# Altium footprint library Transformers.PcbLib: 80 footprints (part 3 of 6)
Each footprint in its own frame and in the unit in brackets; x right, y up, seen from the top. Pads: shape width x height; smd on the part's side, far side on the other; paste and mask are expansions set on the pad; w line width, h text height; cw(c..) or ccw(c..) is an arc to the next point about the centre after c.
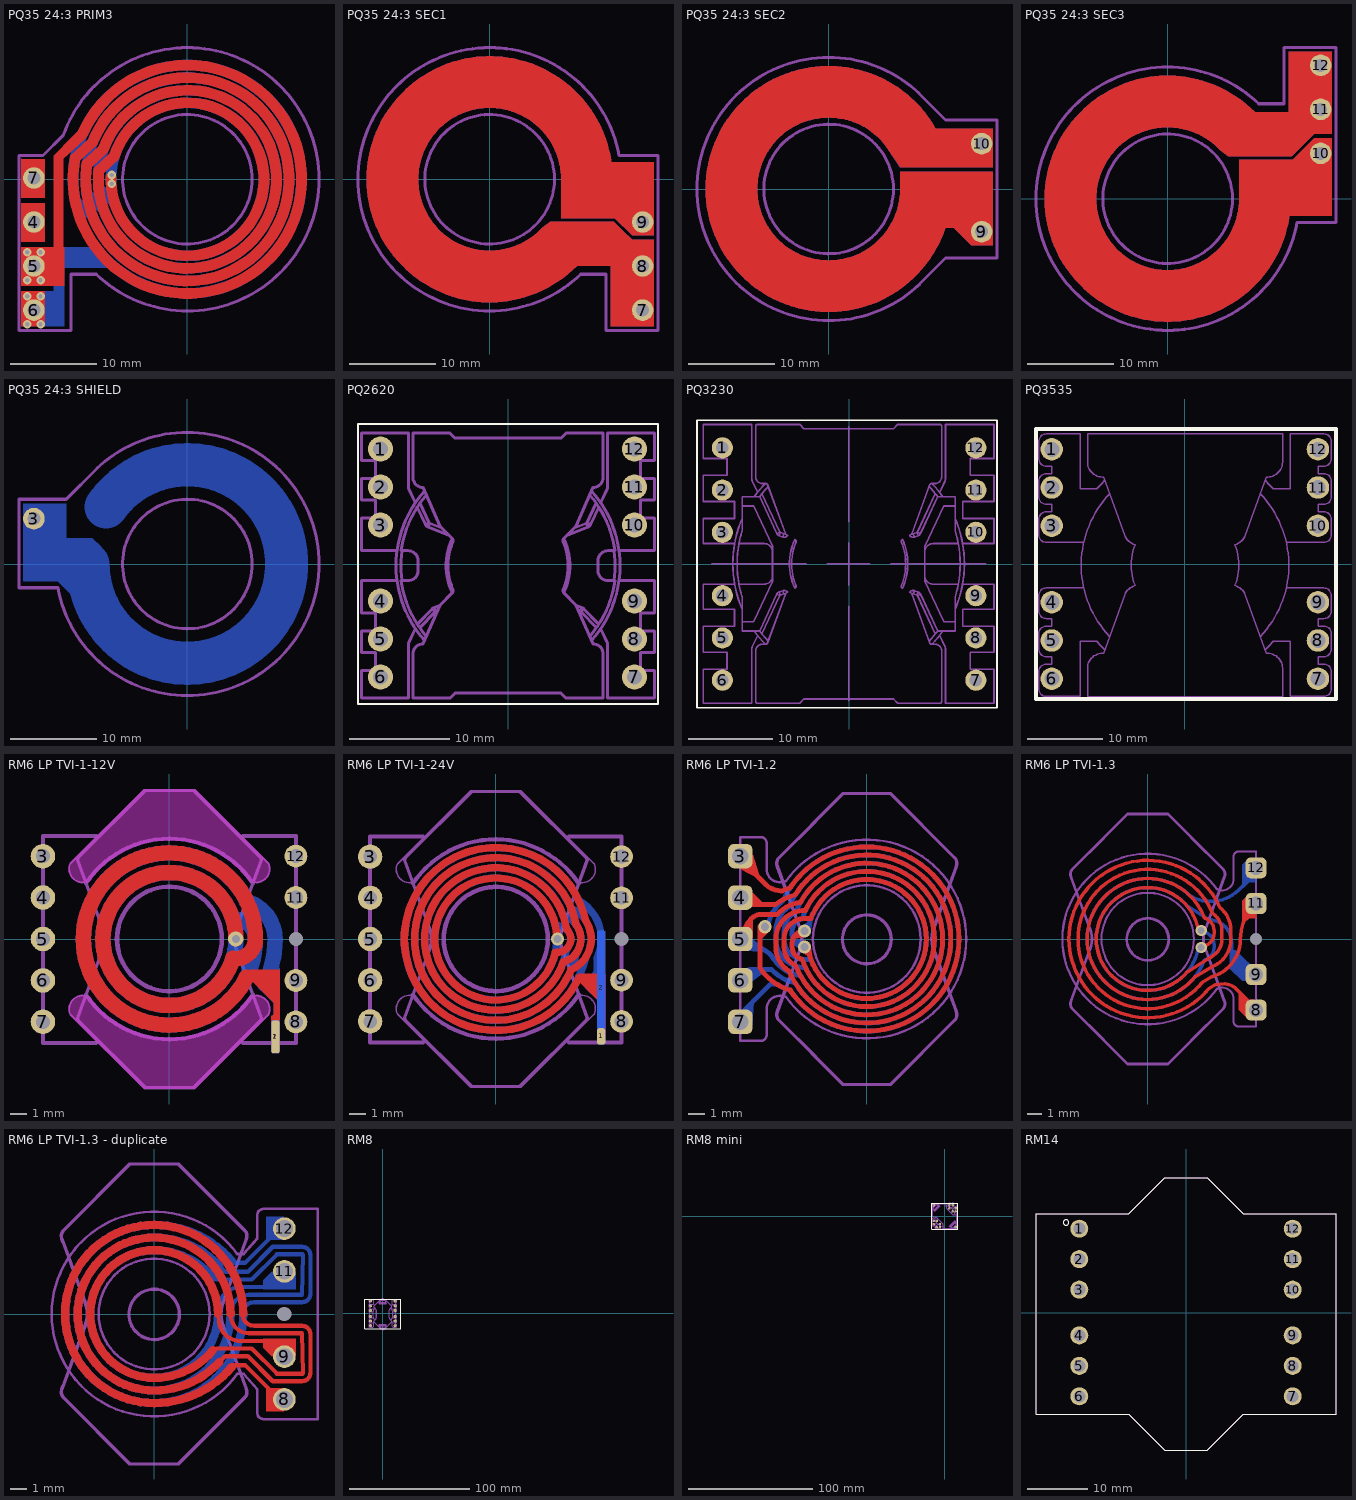
[diagram p2: the footprints below, top view; thin cyan lines are the x and y axes]

## PQ35 24:3 PRIM3 [mm]
pads (4):
  round 2.5 hole 1.5: 4(-17.773,-4.948) 5(-17.773,-10.048) 6(-17.773,-15.148) 7(-17.773,0.152)
via -8.75,0.5 diameter 1 hole 0.5
via -8.75,-0.5 diameter 1 hole 0.5
via -18.546,-11.7 diameter 1 hole 0.5
via -18.546,-8.45 diameter 1 hole 0.5
via -17,-8.45 diameter 1 hole 0.5
via -17,-11.7 diameter 1 hole 0.5
via -18.546,-16.8 diameter 1 hole 0.5
via -18.546,-13.55 diameter 1 hole 0.5
via -17,-13.55 diameter 1 hole 0.5
via -17,-16.8 diameter 1 hole 0.5
Top Layer:
  region: -15.5,-8.832 -15.5,2.752 -15.425,2.812 -15.249,2.886 -15.059,2.908 -14.87,2.876 -14.698,2.794 -14.555,2.666 -14.453,2.504 -14.4,2.32 -14.4,2.225 -14.4,-8.5 -14.4,-8.597 -14.46,-8.78 -14.576,-8.936 -14.734,-9.047 -14.919,-9.103 -15.112,-9.098 -15.294,-9.032 -15.446,-8.913
  region: -19.25,-12.95 -19.25,-17 -16.5,-17 -16.5,-12.95
  region: -19.25,2.35 -19.25,-2.15 -16.5,-2.15 -16.5,2.35
  region: -19.25,-7.85 -19.25,-12.35 -16.5,-12.35 -16.5,-7.85
  region: -19.25,-2.75 -19.25,-7.25 -16.5,-7.25 -16.5,-2.75
  region: 644 vertices and 0 holes, not listed, extent -15.5,-13.824 13.824,13.837
  region: -19.25,-7.85 -19.25,-12.35 -14.25,-12.35 -14.25,-7.85
Bottom Layer:
  region: -10,-7.85 -15,-7.85 -15,-10.25 -8.791,-10.25 -9.543,-8.55 -9.543,-8.439 -9.607,-8.225 -9.728,-8.039 -9.898,-7.895
  region: 629 vertices and 0 holes, not listed, extent -13.832,-13.834 13.824,13.824
  region: -19.25,-12.95 -19.25,-17 -16.5,-17 -16.5,-12.95
  region: -19.25,-7.85 -19.25,-12.35 -16.5,-12.35 -16.5,-7.85
  region: -19.25,-2.75 -19.25,-7.25 -16.5,-7.25 -16.5,-2.75
  region: -19.25,2.35 -19.25,-2.15 -16.5,-2.15 -16.5,2.35
  region: -10,-7.85 -15,-7.85 -15.5,-7.85 -15.5,-13 -14.25,-13 -14.25,-9.25 -10,-9.25 -9.898,-9.205 -9.728,-9.061 -9.607,-8.875 -9.543,-8.661 -9.543,-8.439 -9.607,-8.225 -9.728,-8.039 -9.898,-7.895
  region: -19.25,-12.95 -14.25,-12.95 -14.25,-17 -19.25,-17
  lines w1.2: -17.773,-10.048 -17.548,-10.048
Mechanical 2:
  circle w0.35: c0,0 r7.5
  lines w0.35: -10.53,-11.031 ccw(c0,0) 0,-15.25 ccw(c0,0) 15.25,0 ccw(c0,0) 0,15.25 ccw(c0,0) -14.367,5.114 -16.731,2.75 -19.5,2.75 -19.5,-17.5 -13.5,-17.5 -13.5,-11 -10.53,-11

## PQ35 24:3 SEC1 [mm]
pads (3):
  round 2.5 hole 1.5: 7(17.727,-15.148) 8(17.727,-10.048) 9(17.727,-4.948)
Top Layer:
  rectangle: 16.5,-17 19,-8.5
  rectangle: 16.5,-6.5 19,-3
  region: 19,-17 14,-17 14,-10 10,-10 7,-7 6.1,-5.6 7,-4.9 14.4,-4.9 15.5,-6 16.5,-7 19,-7
  region: 16.5,-6.5 14.5,-4.5 8.3,-4.5 8.3,2 19,2 19,-6.5
  lines w6: 7.963,-7.963 cw(c0,0) 0,-11.262 cw(c0,0) -11.262,0 cw(c0,0) 0,11.262 cw(c0,0) 11.262,0
Bottom Layer:
  region: 16.5,-6.5 14.5,-4.5 8.3,-4.5 8.3,2 19,2 19,-6.5
  region: 19,-17 14,-17 14,-10 10,-10 7,-7 6.1,-5.6 7,-4.9 14.4,-4.9 15.5,-6 16.5,-7 19,-7
  lines w6: 7.963,-7.963 cw(c0,0) 0,-11.262 cw(c0,0) -11.262,0 cw(c0,0) 0,11.262 cw(c0,0) 11.262,0
Mechanical 2:
  circle w0.35: c0,0 r7.5
  lines w0.35: 10.53,-11.031 cw(c0,0) 0,-15.25 cw(c0,0) -15.25,0 cw(c0,0) 0,15.25 cw(c0,0) 15,2.75 19.5,2.75 19.5,-17.5 13.5,-17.5 13.5,-11 10.53,-11

## PQ35 24:3 SEC2 [mm]
pads (2):
  round 2.5 hole 1.5: 9(17.727,-4.948) 10(17.727,5.252)
Top Layer:
  rectangle: 16.5,-6.5 19,-3
  rectangle: 16.5,2.5 19,7
  region: 16.5,-6.5 14.5,-4.5 8.3,-4.5 8.3,2 19,2 19,-6.5
  region: 8.3,7 7.5,3.75 8.3,2.5 19,2.5 19,7
  lines w6: 9.809,5.533 ccw(c0,0) 0,11.262 ccw(c0,0) -11.262,0 ccw(c0,0) 0,-11.262 ccw(c0,0) 11.201,-1.167
Bottom Layer:
  region: 8.3,7 7.481,3.673 8.232,2.5 19,2.5 19,7
  region: 16.5,-6.5 14.5,-4.5 8.3,-4.5 8.3,2 19,2 19,-6.5
  lines w6: 9.809,5.533 ccw(c0,0) 0,11.262 ccw(c0,0) -11.262,0 ccw(c0,0) 0,-11.262 ccw(c0,0) 11.201,-1.167
Mechanical 2:
  circle w0.35: c0,0 r7.5
  lines w0.35: 10.53,-11 13.53,-8 19.5,-8 19.5,8 13.53,8 10.53,11 ; 10.53,11.031 ccw(c0,0) 0,15.25 ccw(c0,0) -15.25,0 ccw(c0,0) 0,-15.25 ccw(c0,0) 10.545,-11.016

## PQ35 24:3 SEC3 [mm]
pads (3):
  round 2.5 hole 1.5: 10(17.727,5.252) 11(17.727,10.352) 12(17.727,15.452)
Top Layer:
  rectangle: 16.5,9 19,17
  region: 19,17 14,17 14,10 10,10 7,7 6.1,5.6 7,4.9 14.4,4.9 15.5,6 17,7.5 19,7.5
  region: 17,7 14.5,4.5 8.3,4.5 8.3,-2 19,-2 19,7
  region: 19,7 17,7 16.5,6.5 16.5,2.5 19,2.5
  lines w6: 7.963,7.963 ccw(c0,0) 0,11.262 ccw(c0,0) -11.262,0 ccw(c0,0) 0,-11.262 ccw(c0,0) 11.262,0
Bottom Layer:
  region: 17,7 14.5,4.5 8.3,4.5 8.3,-2 19,-2 19,7
  region: 19,17 14,17 14,10 10,10 7,7 6.1,5.6 7,4.9 14.4,4.9 15.5,6 17,7.5 19,7.5
  lines w6: 7.963,7.963 ccw(c0,0) 0,11.262 ccw(c0,0) -11.262,0 ccw(c0,0) 0,-11.262 ccw(c0,0) 11.262,0
Mechanical 2:
  circle w0.35: c0,0 r7.5
  lines w0.35: 10.53,11 13.5,11 13.5,17.5 19.5,17.5 19.5,-2.75 15,-2.75 cw(c0,0) 0,-15.25 cw(c0,0) -15.25,0 cw(c0,0) 0,15.25 cw(c0,0) 10.53,11.031

## PQ35 24:3 SHIELD [mm]
pads (1):
  round 2.5 hole 1.5: 3(-17.773,5.252)
Bottom Layer:
  region: -19,7 -19,-2 -15,-2 -10,-7 -10,-1 -10,2 -11,3 -14,3 -14,7
  lines w5: -11.5,0 ccw(c0,0) 0,-11.5 ccw(c0,0) 11.5,0 ccw(c0,0) -9.421,6.595
Mechanical 2:
  circle w0.35: c0,0 r7.5
  lines w0.35: -10.53,11 -14.03,7.5 -17,7.5 -19.5,7.5 -19.5,-2.75 -15,-2.75 ccw(c0,0) 0,-15.25 ccw(c0,0) 15.25,0 ccw(c0,0) 0,15.25 ccw(c0,0) -10.53,11.031

## PQ2620 [mm]
pads (12):
  round 2.5 hole 1.5 paste-25.4: 1(-12.75,11.5) 2(-12.75,7.7) 3(-12.75,3.9) 4(-12.75,-3.7) 5(-12.75,-7.5) 6(-12.75,-11.3) 7(12.65,-11.3) 8(12.65,-7.5) 9(12.65,-3.7) 10(12.65,3.9) 11(12.65,7.7) 12(12.65,11.5)
Top Overlay:
  lines w0.2: -15,-14 -15,14 15,14 15,-14 -15,-14
Mechanical 3:
  text ".Designator / .Comment" at -1.66,3.2 h2
Mechanical 13:
  lines w0.3: -11.095,-1.667 -14.646,-1.667 -14.646,-4.917 -13.246,-4.917 -13.246,-6.717 -14.646,-6.717 -14.646,-8.867 -13.246,-8.867 -13.246,-10.667 -14.646,-10.667 -14.646,-13.417 -9.946,-13.417 -9.946,-8.028 cw(c-9.446,-8.028) -9.899,-7.817 -9.265,-6.455 ; -11.095,1.333 -14.646,1.333 -14.646,4.583 -13.246,4.583 -13.246,6.383 -14.646,6.383 -14.646,8.533 -13.246,8.533 -13.246,10.333 -14.646,10.333 -14.646,13.083 -9.946,13.083 -9.946,7.694 ccw(c-9.446,7.694) -9.899,7.482 -9.265,6.121 ; -10.591,-1.667 cw(c-0.043,-0.167) -10.591,1.333 ; -8.342,-7.636 cw(c0.004,-0.167) -8.342,7.302 ; -8.164,-7.233 cw(c0.004,-0.167) -8.838,-6.369 ; -8.164,6.898 ccw(c0.004,-0.167) -8.805,6.082 ; -7.037,-4.665 -7.249,-4.743 ; -6.815,-4.159 -7.386,-4.367 ; -6.582,3.569 -7.842,4.08 ; -5.856,2.843 -7.992,3.709 ; -5.57,-2.883 cw(c0.004,-0.167) -5.57,2.549 ; 5.577,-2.883 ccw(c0.004,-0.167) 5.577,2.549 ; 5.864,2.843 8,3.709 ; 6.59,3.569 7.849,4.08 ; 6.822,-4.159 7.393,-4.367 ; 7.045,-4.665 7.257,-4.743 ; 8.172,-7.233 ccw(c0.004,-0.167) 8.845,-6.369 ; 8.172,6.898 cw(c0.004,-0.167) 8.812,6.082 ; 8.349,-7.636 ccw(c0.004,-0.167) 8.349,7.302 ; 9.272,-6.455 9.907,-7.817 cw(c9.454,-8.028) 9.954,-8.028 9.954,-13.417 14.654,-13.417 14.654,-10.667 13.254,-10.667 13.254,-8.867 14.654,-8.867 14.654,-6.717 13.254,-6.717 13.254,-4.917 14.654,-4.917 14.654,-1.667 11.103,-1.667 ; 9.272,6.121 9.907,7.482 ccw(c9.454,7.694) 9.954,7.694 9.954,13.083 14.654,13.083 14.654,10.333 13.254,10.333 13.254,8.533 14.654,8.533 14.654,6.383 13.254,6.383 13.254,4.583 14.654,4.583 14.654,1.333 11.103,1.333 ; 10.598,-1.667 ccw(c0.051,-0.167) 10.598,1.333 ; -9.066,-6.03 ccw(c0.004,-0.167) -8.838,-6.369 ; -9.066,-6.03 cw(c0.004,-0.167) -10.692,-1.667 -9.996,-1.667 ccw(c-9.996,-0.667) -8.996,-0.667 -8.996,0.333 ccw(c-9.996,0.333) -9.996,1.333 -10.692,1.333 cw(c0.004,-0.167) -9.066,5.696 ; -9.066,-6.03 -7.574,-4.489 ; -9.066,5.696 cw(c0.004,-0.167) -8.805,6.082 ; -9.066,5.696 -8.257,3.961 ; -8.838,-6.369 -7.287,-4.767 ; -8.805,6.082 -7.895,4.13 ; -8.257,3.961 ccw(c-7.804,4.172) -7.992,3.709 ; -8.257,3.961 -7.895,4.13 ; -7.992,3.709 -7.842,4.08 ; -7.895,4.13 -7.873,4.1 -7.842,4.08 ; -7.574,-4.489 cw(c-7.215,-4.837) -7.386,-4.367 ; -7.574,-4.489 -7.287,-4.767 ; -7.386,-4.367 -7.249,-4.743 ; -7.287,-4.767 cw(c-7.215,-4.837) -7.249,-4.743 ; 7.257,-4.743 cw(c7.222,-4.837) 7.294,-4.767 ; 7.257,-4.743 7.393,-4.367 ; 7.294,-4.767 8.845,-6.369 ; 7.294,-4.767 7.582,-4.489 ; 7.393,-4.367 cw(c7.222,-4.837) 7.582,-4.489 ; 7.582,-4.489 9.074,-6.03 ; 7.849,4.08 8,3.709 ; 7.849,4.08 7.881,4.1 7.902,4.13 ; 7.902,4.13 8.812,6.082 ; 7.902,4.13 8.265,3.961 ; 8,3.709 ccw(c7.812,4.172) 8.265,3.961 ; 8.265,3.961 9.074,5.696 ; 8.812,6.082 cw(c0.004,-0.167) 9.074,5.696 ; 8.845,-6.369 ccw(c0.004,-0.167) 9.074,-6.03 ; 9.074,-6.03 ccw(c0.004,-0.167) 10.699,-1.667 10.004,-1.667 cw(c10.004,-0.667) 9.004,-0.667 9.004,0.333 cw(c10.004,0.333) 10.004,1.333 10.699,1.333 ccw(c0.004,-0.167) 9.074,5.696 ; -9.496,-13.417 -9.496,-8.988 cw(c-8.496,-8.988) -8.496,-7.988 -6.796,-4.117 -5.612,-2.933 ccw(c-5.895,-2.65) -5.526,-2.495 cw(c0.004,-0.167) -5.526,2.161 ccw(c-5.895,2.316) -5.612,2.599 -6.796,3.783 -8.496,7.654 cw(c-8.496,8.654) -9.496,8.654 -9.496,13.083 -5.796,13.083 -5.296,12.583 5.304,12.583 5.804,13.083 9.504,13.083 9.504,8.654 cw(c8.504,8.654) 8.504,7.654 6.804,3.783 5.62,2.599 ccw(c5.902,2.316) 5.534,2.161 cw(c0.004,-0.167) 5.534,-2.495 ccw(c5.902,-2.65) 5.62,-2.933 6.804,-4.117 8.504,-7.988 cw(c8.504,-8.988) 9.504,-8.988 9.504,-13.417 5.804,-13.417 5.304,-12.917 -5.296,-12.917 -5.796,-13.417 -9.496,-13.417
  text "1" at -12,11 h1.52
  text "12" at 11,11 h1.52
3D body "User Library-PQ 26_20.step": height 25.43, standoff -3.6, extent -14.65,-13.25 14.65,13.25

## PQ3230 [mm]
pads (12):
  round 2.5 hole 1.5 paste-25.4: 1(-15,13.75) 2(-15,8.75) 3(-15,3.75) 4(-15,-3.75) 5(-15,-8.75) 6(-15,-13.75) 7(15,-13.75) 8(15,-8.75) 9(15,-3.75) 10(15,3.75) 11(15,8.75) 12(15,13.75)
Top Overlay:
  lines w0.2: -18,-17 -18,17 17.5,17 17.5,-16.5 17.5,-17 -18,-17
Mechanical 13:
  drawing of 220 lines, arcs and shapes, not listed
3D body "User Library-PQ 32_30.step": height 35.9, standoff -1.9, extent -17.2,-16.5 17.2,16.5

## PQ3535 [mm]
pads (12):
  round 3 hole 2: 1(-17.75,15.3) 2(-17.75,10.2) 3(-17.75,5.1) 4(-17.75,-5.1) 5(-17.75,-10.2) 6(-17.75,-15.3) 7(17.75,-15.3) 8(17.75,-10.2) 9(17.75,-5.1) 10(17.75,5.1) 11(17.75,10.2) 12(17.75,15.3)
Top Overlay:
  lines w0.5: -19.85,-18 -19.85,17 -19.85,18 20.15,18 20.15,-18 -19.85,-18
Mechanical 3:
  text ".Designator / .Comment" at -2.2,-0.66 h2
Mechanical 13:
  lines w0.2: -13.48,-3.194 -18.481,-3.194 ccw(c-18.481,-4.194) -19.481,-4.194 -19.481,-6.274 ccw(c-18.481,-6.274) -18.481,-7.274 -17.761,-7.274 -17.761,-8.274 -18.481,-8.274 ccw(c-18.481,-9.274) -19.481,-9.274 -19.481,-11.354 ccw(c-18.481,-11.354) -18.481,-12.354 -17.761,-12.354 -17.761,-13.354 -18.481,-13.354 ccw(c-18.481,-14.354) -19.481,-14.354 -19.481,-16.654 ccw(c-18.481,-16.654) -18.481,-17.654 -13.981,-17.654 -13.981,-10.314 -11.753,-10.314 -11.172,-10.951 -10.673,-11.445 ; -13.48,2.886 -18.481,2.886 cw(c-18.481,3.886) -19.481,3.886 -19.481,5.966 cw(c-18.481,5.966) -18.481,6.966 -17.761,6.966 -17.761,7.966 -18.481,7.966 cw(c-18.481,8.966) -19.481,8.966 -19.481,11.046 cw(c-18.481,11.046) -18.481,12.046 -17.761,12.046 -17.761,13.046 -18.481,13.046 cw(c-18.481,14.046) -19.481,14.046 -19.481,16.346 cw(c-18.481,16.346) -18.481,17.346 -13.981,17.346 -13.981,10.006 -11.753,10.006 -11.172,10.642 -10.673,11.136 ; -10.027,-9.67 cw(c0.019,-0.154) -10.027,9.361 ; 10.066,-9.67 ccw(c0.019,-0.154) 10.066,9.361 ; 10.712,-11.445 11.21,-10.951 11.791,-10.314 14.019,-10.314 14.019,-17.654 18.519,-17.654 ccw(c18.519,-16.654) 19.519,-16.654 19.519,-14.354 ccw(c18.519,-14.354) 18.519,-13.354 17.799,-13.354 17.799,-12.354 18.519,-12.354 ccw(c18.519,-11.354) 19.519,-11.354 19.519,-9.274 ccw(c18.519,-9.274) 18.519,-8.274 17.799,-8.274 17.799,-7.274 18.519,-7.274 ccw(c18.519,-6.274) 19.519,-6.274 19.519,-4.194 ccw(c18.519,-4.194) 18.519,-3.194 13.519,-3.194 ; 10.712,11.136 11.21,10.642 11.791,10.006 14.019,10.006 14.019,17.346 18.519,17.346 cw(c18.519,16.346) 19.519,16.346 19.519,14.046 cw(c18.519,14.046) 18.519,13.046 17.799,13.046 17.799,12.046 18.519,12.046 cw(c18.519,11.046) 19.519,11.046 19.519,8.966 cw(c18.519,8.966) 18.519,7.966 17.799,7.966 17.799,6.966 18.519,6.966 cw(c18.519,5.966) 19.519,5.966 19.519,3.886 cw(c18.519,3.886) 18.519,2.886 13.519,2.886 ; -12.981,-17.704 -12.981,-13.904 cw(c-10.981,-13.904) -10.981,-11.904 -10.841,-11.904 -8.013,-4.136 cw(c-6.134,-4.82) -6.888,-2.968 -6.626,-2.861 cw(c0.019,-0.154) -6.626,2.552 -6.888,2.659 cw(c-6.134,4.511) -8.013,3.827 -10.841,11.596 -10.981,11.596 cw(c-10.981,13.596) -12.981,13.596 -12.981,17.396 13.019,17.396 13.019,13.596 cw(c11.019,13.596) 11.019,11.596 10.879,11.596 8.052,3.827 cw(c6.172,4.511) 6.927,2.659 6.664,2.552 cw(c0.019,-0.154) 6.664,-2.861 6.927,-2.968 cw(c6.172,-4.82) 8.052,-4.136 10.879,-11.904 11.019,-11.904 cw(c11.019,-13.904) 13.019,-13.904 13.019,-17.704 -12.981,-17.704
  text "12" at 15.15,14 h1
  text "7" at 15.15,-16 h1
  text "6" at -15.85,-16 h1
  text "1" at -15.85,14 h1
3D body "PQ35x35-K-12P-P-3529-1_zÈo-enie.STEP": height 39.8, standoff -5, extent -19.4,-17.6 19.7,17.6

## RM6 LP TVI-1-12V [mm]
pads (12):
  rrect50% 0.5x2 smd: 1(6.5,-6)
  rrect50% 0.5x2 smd far side: 2(6.5,-6)
  round 1.5 hole 0.85: 3(-7.75,5.08) 4(-7.75,2.54) 5(-7.75,0) 6(-7.75,-2.54) 7(-7.75,-5.08)
  round 1.4 hole 0.85: 8(7.75,-5.08) 9(7.75,-2.54) 11(7.75,2.54) 12(7.75,5.08)
  round 0 hole 0.85: 10(7.75,0)
via 4.075,0 diameter 0.95 hole 0.5
Top Layer:
  region: 6.4,-3.9 4.65,-2.15 4.9,-1.9 6.75,-1.9 6.75,-3 6.75,-3.7 6.75,-4.5 6.75,-5.4 6.5,-5.4 6.25,-5.5 6.25,-4.75 6.4,-4.6
  lines w0.254: 4.75,-2.25 5.293,-2.25 cw(c5.293,-3.957) 6.5,-2.75 6.5,-6
  lines w0.95: 3.898,-1.188 cw(c0,0) -4.075,0 cw(c0,0) 0,4.075 cw(c0,0) 4.075,0 ; 3.898,-1.187 ccw(c4.075,0) 5.275,0 ccw(c0,0) 0,5.275 ccw(c0,0) -5.275,0 ccw(c0,0) 4.718,-2.359
Bottom Layer:
  region: 6.25,-3.8 5.475,-3.025 6.75,-1.75 6.75,-5.5 6.25,-5.5 6.25,-4.75 6.4,-4.6 6.4,-3.95
  lines w0.95: 3.898,1.187 cw(c4.075,0) 5.275,0 cw(c0,0) 0,-5.275 cw(c0,0) -5.275,0 cw(c0,0) 4.718,2.359 ; 3.898,1.188 ccw(c0,0) -4.075,0 ccw(c0,0) 0,-4.075 ccw(c0,0) 4.075,0 ; 4.713,2.314 cw(c4.075,0) 6.475,0 cw(c0,0) 5.85,-2.776
Keep-Out Layer:
  drawing of 2 lines, arcs and shapes, not listed
Mechanical 2:
  circle w0.102: c0,0 r3.302
  lines w0.102: -6.057,-4.651 cw(c-5.329,-4.289) -4.978,-3.556 ; -6.057,4.651 ccw(c-5.329,4.289) -4.978,3.556 ; -6.05,-4.643 -1.549,-9.144 1.549,-9.144 6.05,-4.643 ; -6.05,4.643 -1.549,9.144 1.549,9.144 6.05,4.643 ; -5.931,4.763 -1.57,9.124 ; -4.96,-3.543 ccw(c0,0) 4.961,-3.543 ; -4.961,3.543 cw(c0,0) 4.96,3.543 ; 1.57,-9.124 5.931,-4.763 ; 4.978,-3.556 cw(c5.329,-4.289) 6.057,-4.651 ; 4.978,3.556 ccw(c5.329,4.289) 6.057,4.651
Mechanical 13:
  circle w0.254: c0,0 r3.2
  lines w0.2: -1.486,-9.1 1.486,-9.1 ; -1.486,-9.086 -5.577,-4.996 -5.635,-4.871 -4.103,-0.661 ; -1.486,9.086 -5.577,4.996 -5.635,4.871 -4.103,0.661 ; -1.486,9.1 1.486,9.1 ; 1.486,-9.086 5.577,-4.996 ; 1.486,9.086 5.577,4.996 ; -4.103,-0.707 ccw(c-5.982,-0.023) -4.103,0.661 ; -4.103,-0.707 ccw(c-5.982,-0.023) -4.103,0.661 ; -4.103,-0.707 ccw(c-5.982,-0.023) -4.103,0.661 ; -4.103,-0.707 ccw(c-5.982,-0.023) -4.103,0.661 ; -4.103,-0.661 ccw(c-5.982,0.023) -4.103,0.707 ; -4.103,-0.661 ccw(c-5.982,0.023) -4.103,0.707 ; -4.103,-0.661 ccw(c-5.982,0.023) -4.103,0.707 ; -4.103,-0.661 ccw(c-5.982,0.023) -4.103,0.707 ; 4.103,-0.707 cw(c5.982,-0.023) 4.103,0.661 ; 4.103,-0.707 cw(c5.982,-0.023) 4.103,0.661 ; 4.103,-0.707 cw(c5.982,-0.023) 4.103,0.661 ; 4.103,-0.707 cw(c5.982,-0.023) 4.103,0.661 ; 4.103,-0.661 cw(c5.982,0.023) 4.103,0.707 ; 4.103,-0.661 cw(c5.982,0.023) 4.103,0.707 ; 4.103,-0.661 cw(c5.982,0.023) 4.103,0.707 ; 4.103,-0.661 cw(c5.982,0.023) 4.103,0.707 ; 4.103,-0.661 5.49,-4.471 4.103,-0.661 ; 4.103,-0.661 5.635,-4.871 ; 4.103,0.661 5.635,4.871 ; 4.103,0.661 5.49,4.471 4.103,0.661 ; 5.577,-4.996 5.635,-4.871 ; 5.577,-4.996 5.635,-4.871 ; 5.577,4.996 5.635,4.871 ; 5.577,4.996 5.635,4.871
  lines w0.25: -4.5,-6.375 -7.75,-6.375 -7.75,6.323 -4.5,6.323 ; 4.5,-6.375 7.75,-6.375 7.75,6.323 4.5,6.323
  lines w0.254: -5.117,-3.411 ccw(c0,0) 5.117,-3.412 ; -5.117,3.411 cw(c0,0) 5.117,3.412
3D body "User Library-rm_6.step": height 4, standoff -0.5, extent -5.235,-8.9 5.235,9
3D body "User Library-rm_6.step": height 4, standoff -0.5, extent -5.235,-8.9 5.235,9

## RM6 LP TVI-1-24V [mm]
pads (12):
  rrect50% 0.5x1 smd: 1(6.5,-6)
  rrect50% 0.5x7 smd far side: 2(6.5,-3)
  round 1.5 hole 0.85: 3(-7.75,5.08) 4(-7.75,2.54) 5(-7.75,0) 6(-7.75,-2.54) 7(-7.75,-5.08)
  round 1.4 hole 0.85: 8(7.75,-5.08) 9(7.75,-2.54) 11(7.75,2.54) 12(7.75,5.08)
  round 0 hole 0.85: 10(7.75,0)
via 3.8,0 diameter 0.8 hole 0.5
Top Layer:
  region: 605 vertices and 0 holes, not listed, extent -5.85,-5.853 6.088,5.85
  region: 6.4,-3.9 4.888,-2.387 5.125,-2.15 6.75,-2.15 6.75,-3 6.75,-3.7 6.75,-4.5 6.75,-6 6.25,-6 6.25,-4.75 6.4,-4.6
Bottom Layer:
  region: 576 vertices and 0 holes, not listed, extent -5.85,-5.85 6.713,5.852
  region: 5.492,-2.992 6.025,-1.951 6.025,-1.15 6.3,-1.15 6.3,-3.8
Mechanical 2:
  circle w0.102: c0,0 r3.302
  lines w0.102: -6.057,-4.651 cw(c-5.329,-4.289) -4.978,-3.556 ; -6.057,4.651 ccw(c-5.329,4.289) -4.978,3.556 ; -6.05,-4.643 -1.549,-9.144 1.549,-9.144 6.05,-4.643 ; -6.05,4.643 -1.549,9.144 1.549,9.144 6.05,4.643 ; -5.931,4.763 -1.57,9.124 ; -4.96,-3.543 ccw(c0,0) 4.961,-3.543 ; -4.961,3.543 cw(c0,0) 4.96,3.543 ; 1.57,-9.124 5.931,-4.763 ; 4.978,-3.556 cw(c5.329,-4.289) 6.057,-4.651 ; 4.978,3.556 ccw(c5.329,4.289) 6.057,4.651
Mechanical 13:
  circle w0.254: c0,0 r3.2
  lines w0.2: -1.486,-9.1 1.486,-9.1 ; -1.486,-9.086 -5.577,-4.996 -5.635,-4.871 -4.103,-0.661 ; -1.486,9.086 -5.577,4.996 -5.635,4.871 -4.103,0.661 ; -1.486,9.1 1.486,9.1 ; 1.486,-9.086 5.577,-4.996 ; 1.486,9.086 5.577,4.996 ; -4.103,-0.707 ccw(c-5.982,-0.023) -4.103,0.661 ; -4.103,-0.707 ccw(c-5.982,-0.023) -4.103,0.661 ; -4.103,-0.707 ccw(c-5.982,-0.023) -4.103,0.661 ; -4.103,-0.707 ccw(c-5.982,-0.023) -4.103,0.661 ; -4.103,-0.661 ccw(c-5.982,0.023) -4.103,0.707 ; -4.103,-0.661 ccw(c-5.982,0.023) -4.103,0.707 ; -4.103,-0.661 ccw(c-5.982,0.023) -4.103,0.707 ; -4.103,-0.661 ccw(c-5.982,0.023) -4.103,0.707 ; 4.103,-0.707 cw(c5.982,-0.023) 4.103,0.661 ; 4.103,-0.707 cw(c5.982,-0.023) 4.103,0.661 ; 4.103,-0.707 cw(c5.982,-0.023) 4.103,0.661 ; 4.103,-0.707 cw(c5.982,-0.023) 4.103,0.661 ; 4.103,-0.661 cw(c5.982,0.023) 4.103,0.707 ; 4.103,-0.661 cw(c5.982,0.023) 4.103,0.707 ; 4.103,-0.661 cw(c5.982,0.023) 4.103,0.707 ; 4.103,-0.661 cw(c5.982,0.023) 4.103,0.707 ; 4.103,-0.661 5.49,-4.471 4.103,-0.661 ; 4.103,-0.661 5.635,-4.871 ; 4.103,0.661 5.635,4.871 ; 4.103,0.661 5.49,4.471 4.103,0.661 ; 5.577,-4.996 5.635,-4.871 ; 5.577,-4.996 5.635,-4.871 ; 5.577,4.996 5.635,4.871 ; 5.577,4.996 5.635,4.871
  lines w0.25: -4.5,-6.375 -7.75,-6.375 -7.75,6.323 -4.5,6.323 ; 4.5,-6.375 7.75,-6.375 7.75,6.323 4.5,6.323
  lines w0.254: -5.117,-3.411 ccw(c0,0) 5.117,-3.412 ; -5.117,3.411 cw(c0,0) 5.117,3.412
3D body "User Library-rm_6.step": height 4, standoff -0.5, extent -5.235,-8.9 5.235,9
3D body "User Library-rm_6.step": height 4, standoff -0.5, extent -5.235,-8.9 5.235,9

## RM6 LP TVI-1.2 [mm]
pads (5):
  rrect50% 1.5x1.5 hole 1: 3(-7.75,5.08) 4(-7.75,2.54) 5(-7.75,0) 6(-7.75,-2.54) 7(-7.75,-5.08)
via -3.825,-0.5 diameter 0.8 hole 0.5
via -3.825,0.5 diameter 0.8 hole 0.5
via -3.825,-0.5 diameter 0.8 hole 0.5
via -6.25,0.75 diameter 0.8 hole 0.5
Top Layer:
  region: -7.245,-0.293 -7,0.044 -7,1.455 -7.377,1.077 -7.965,-0.013
  region: -7.8,1.97 -6.425,1.97 -6.225,2.07 -7.215,3.06
  region: -7.8,4.3 -6.619,3.693 -6.619,4 -7,5.2
  region: -3.85,-0.9 -3.65,-1.025 -3.35,-1.025 -3.475,-0.3
  region: -4.225,0.525 -4.45,0.165 -4.45,0.008 -3.625,0.15
  region: -6.7,-0.225 -6.087,0.387 -6.612,0.912 -6.7,0.825
  lines w0.3: -7.8,4.95 -6.193,3.343 ccw(c-5.254,4.282) -5.254,2.954 -5.179,2.954 cw(c-3.825,0) -4.711,3.127 ; -7.75,2.54 -7.318,2.108 -5.591,2.108 cw(c-3.825,0) -4.392,2.691 ; -7.75,5.08 cw(c-7.75,4.67) -7.46,4.96 ; -7.3,0.7 cw(c-6.499,0.7) -6.499,1.501 -5.501,1.501 cw(c-3.825,0) -4.073,2.236 ; -6.557,-1.761 ccw(c-3.825,0) -4.689,-3.133 ; -6.55,-1.761 -6.55,0.45 ; -4.78,-1.966 cw(c-3.825,-0.5) -5.575,-0.5 -5.575,0 cw(c-3.825,0) -3.947,1.746 -3.761,1.746 ; -4.744,-2.003 ccw(c0,0) 0,-5.15 ccw(c0,0) 5.15,0 ccw(c0,0) -4.392,2.689 ; -4.693,3.146 cw(c0,0) 0,5.65 cw(c0,0) 5.65,0 cw(c0,0) -4.693,-3.146 ; -4.365,-1.627 cw(c-3.825,-0.5) -5.075,-0.5 -5.075,0 cw(c-3.825,0) -3.91,1.247 -3.44,1.247 ; -4.357,-1.624 ccw(c0,0) 0,-4.65 ccw(c0,0) 4.65,0 ccw(c0,0) -4.076,2.238 ; -3.997,-1.23 cw(c-3.825,-0.5) -4.575,-0.5 -4.575,-0.25 cw(c-3.825,-0.25) -3.825,0.5 ; -3.959,-1.243 ccw(c0,0) 0,-4.15 ccw(c0,0) 4.15,0 ccw(c0,0) -3.761,1.754 ; -3.584,-0.689 ccw(c0,0) 0,-3.65 ccw(c0,0) 3.65,0 ccw(c0,0) -3.428,1.255 ; -6.55,0.45 cw(c-6.25,0.45) -6.25,0.75 -6.55,0.45
Mid-Layer 14:
  lines w0.15: -7.75,-5.58 ccw(c-7.75,-5.08) -7.75,-4.58 ; -7.75,-3.04 ccw(c-7.75,-2.54) -7.75,-2.04 ; -7.75,2.04 ccw(c-7.75,2.54) -7.75,3.04 ; -7.75,4.58 ccw(c-7.75,5.08) -7.75,5.58
Bottom Layer:
  region: -7.75,-1.94 -6.35,-1.84 -6.15,-1.94 -7.75,-3.14
  region: -7.7,-0.7 -6.3,-0.8 -6.1,-0.7 -7.7,0.5
  region: -4.225,-0.525 -4.45,-0.165 -4.45,-0.008 -3.625,-0.15
  region: -3.85,0.9 -3.65,1.025 -3.35,1.025 -3.475,0.3
  region: -7.025,-5.275 -6.925,-3.875 -7.025,-3.675 -8.225,-5.275
  lines w0.3: -7.75,-2.54 cw(c-7.071,-2.54) -7.071,-1.861 -5.849,-1.861 ccw(c-3.825,0) -4.392,-2.691 ; -7.75,-0.25 -7.722,-0.25 cw(c-7.722,-2.938) -5.822,-1.037 ccw(c-3.825,0) -4.073,-2.236 ; -7.46,-4.96 cw(c-7.75,-4.67) -7.75,-5.08 cw(c-6.618,-5.08) -7.419,-4.28 -6.046,-2.907 -5.914,-2.776 -5.516,-2.776 ccw(c-3.825,0) -4.715,-3.126 ; -6.063,0.731 cw(c-3.825,0.5) -5.218,2.267 ; -5.15,2.323 cw(c0,0) 5.65,0 cw(c0,0) 0,-5.65 cw(c0,0) -4.709,-3.122 ; -4.78,1.966 ccw(c-3.825,0.5) -5.575,0.5 -5.575,0 ccw(c-3.825,0) -3.947,-1.746 -3.761,-1.746 ; -4.744,2.003 cw(c0,0) 0,5.15 cw(c0,0) 5.15,0 cw(c0,0) -4.392,-2.689 ; -4.365,1.627 ccw(c-3.825,0.5) -5.075,0.5 -5.075,0 ccw(c-3.825,0) -3.91,-1.247 -3.44,-1.247 ; -4.357,1.624 cw(c0,0) 0,4.65 cw(c0,0) 4.65,0 cw(c0,0) -4.076,-2.238 ; -3.997,1.23 ccw(c-3.825,0.5) -4.575,0.5 -4.575,0.25 ccw(c-3.825,0.25) -3.825,-0.5 ; -3.959,1.243 cw(c0,0) 0,4.15 cw(c0,0) 4.15,0 cw(c0,0) -3.761,-1.754 ; -3.584,0.689 cw(c0,0) 0,3.65 cw(c0,0) 3.65,0 cw(c0,0) -3.428,-1.255
Mechanical 2:
  circle w0.15: c0,0 r3.302
  lines w0.15: -4.978,-3.556 ccw(c-5.329,-4.289) -6.141,-4.301 -6.141,-5.706 -6.141,-5.891 cw(c-6.5,-5.891) -6.5,-6.25 -7.75,-6.25 -7.75,6.25 ; -4.978,3.556 cw(c-5.329,4.289) -6.141,4.301 -6.141,5.706 -6.141,5.891 ccw(c-6.5,5.891) -6.5,6.25 -7.541,6.25 -7.75,6.25 ; -4.961,-3.543 ccw(c0,0) 6.096,0 ccw(c0,0) -4.961,3.543 ; -7.75,6.25 ccw(c-7.75,6.25) -7.75,6.25 ; -7.75,6.25 ccw(c-7.75,6.25) -7.75,6.25 ; -7.75,6.25 -7.75,6.25
Mechanical 13:
  circle w0.2: c0.002,-0.023 r1.5
  lines w0.2: -5.434,-4.308 -5.493,-4.471 ccw(c-5.023,-4.642) -5.377,-4.996 -1.446,-8.927 1.446,-8.927 5.377,-4.996 ccw(c5.023,-4.642) 5.493,-4.471 5.434,-4.308 ; -5.434,4.308 -5.493,4.471 cw(c-5.023,4.642) -5.377,4.996 -1.446,8.927 1.446,8.927 5.377,4.996 cw(c5.023,4.642) 5.493,4.471 5.434,4.308 ; -4.103,-0.707 ccw(c-5.982,-0.023) -4.103,0.661 -5.49,4.471 cw(c-5.02,4.642) -5.373,4.996 -3.14,7.23 ; -4.103,0.707 cw(c-5.982,0.023) -4.103,-0.661 -5.49,-4.471 ccw(c-5.02,-4.642) -5.373,-4.996 -3.14,-7.23 ; 0,1.477 cw(c-0.002,-0.023) 1.498,-0.023 ; 3.14,-7.23 5.373,-4.996 ccw(c5.02,-4.642) 5.49,-4.471 4.103,-0.661 cw(c5.982,0.023) 4.103,0.707 ; 3.14,7.23 5.373,4.996 cw(c5.02,4.642) 5.49,4.471 4.103,0.661 ccw(c5.982,-0.023) 4.103,-0.707

## RM6 LP TVI-1.3 [mm]
pads (5):
  rrect50% 1.5x1.5 hole 1: 8(7.75,-5.08) 9(7.75,-2.54) 11(7.75,2.54) 12(7.75,5.08)
  round 0 hole 0.85: 10(7.75,0)
via 3.825,-0.6 diameter 0.8 hole 0.5
via 3.825,0.6 diameter 0.8 hole 0.5
Top Layer:
  region: 6.525,-5.065 7.25,-5.79 7.75,-5.29 7.75,-4.325 7.25,-4.325 6.525,-3.6
  region: 6.75,2.75 7.25,3.25 7.75,2.75 7.75,1.5 7.25,1.5 6.875,1.125 6.75,1.25
  lines w0.25: 3.638,0.52 ccw(c0,0) 0,3.675 ccw(c0,0) -3.675,0 ccw(c0,0) 2.831,-2.343 4.353,-1.377 ccw(c3.825,0) 5.3,0 5.3,0.6 ccw(c3.825,0.6) 4.623,1.841 ; 4.045,-0.499 ccw(c3.825,0.4) 4.75,0.4 4.75,0.6 ccw(c3.825,0.6) 4.064,1.493 ; 4.05,1.519 ccw(c0,0) 0,4.325 ccw(c0,0) -4.325,0 ccw(c0,0) 3.377,-2.702 4.586,-1.984 ccw(c3.825,0) 5.95,0 5.95,0.6 ccw(c3.825,0.6) 5.146,2.264 ; 4.6,-2.691 ccw(c3.825,0) 6.625,0 cw(c10.041,0) 7.626,2.416 7.75,2.54 ; 4.6,-2.69 3.873,-3.121 cw(c0,0) -4.975,0 cw(c0,0) 4.623,1.838 ; 5.149,2.265 ccw(c0,0) -5.625,0 ccw(c0,0) 4.371,-3.54 4.852,-3.254 5.5,-3.204 cw(c5.5,-4.3) 6.275,-3.525 ; 6.25,-3.5 7.693,-4.943 cw(c7.557,-5.08) 7.75,-5.08
Mid-Layer 14:
  lines w0.15: 7.75,-5.58 cw(c7.75,-5.08) 7.75,-4.58 ; 7.75,-3.04 cw(c7.75,-2.54) 7.75,-2.04 ; 7.75,2.04 cw(c7.75,2.54) 7.75,3.04 ; 7.75,4.58 cw(c7.75,5.08) 7.75,5.58
Bottom Layer:
  region: 6.29,-0.79 8,-2.5 7.5,-3 6.75,-3 5.875,-2.125 5.875,-0.79
  region: 6.75,5.29 7.25,5.79 7.75,5.29 7.75,4.04 7.25,4.04 6.875,3.665 6.75,3.79
  lines w0.25: 3.638,-0.52 cw(c0,0) 0,-3.675 cw(c0,0) -3.675,0 cw(c0,0) 2.831,2.343 4.353,1.377 cw(c4.353,-0.27) 6,-0.27 6,-0.79 ccw(c7.75,-0.79) 7.75,-2.54 ; 4.045,0.499 cw(c3.825,-0.4) 4.75,-0.4 4.75,-0.6 cw(c3.825,-0.6) 4.064,-1.493 ; 4.05,-1.519 cw(c0,0) 0,-4.325 cw(c0,0) -4.325,0 cw(c0,0) 2.637,3.428 ccw(c4.39,5.182) 4.39,2.702 4.573,2.702 ccw(c4.573,5.427) 6.5,3.5 7.517,4.517 ccw(c6.953,5.08) 7.75,5.08
Mechanical 2:
  circle w0.15: c0,0 r3.302
  lines w0.15: 4.961,-3.543 cw(c0,0) -6.096,0 cw(c0,0) 4.961,3.543 ; 4.978,-3.556 cw(c5.329,-4.289) 6.141,-4.301 6.141,-5.706 6.141,-5.891 ccw(c6.5,-5.891) 6.5,-6.25 7.75,-6.25 7.75,6.25 ; 4.978,3.556 ccw(c5.329,4.289) 6.141,4.301 6.141,5.706 6.141,5.891 cw(c6.5,5.891) 6.5,6.25 7.541,6.25 7.75,6.25 ; 7.75,6.25 ccw(c7.75,6.25) 7.75,6.25 ; 7.75,6.25 ccw(c7.75,6.25) 7.75,6.25 ; 7.75,6.25 7.75,6.25
Mechanical 13:
  circle w0.2: c0.002,-0.023 r1.5
  lines w0.2: -5.434,-4.308 -5.493,-4.471 ccw(c-5.023,-4.642) -5.377,-4.996 -1.446,-8.927 1.446,-8.927 5.377,-4.996 ccw(c5.023,-4.642) 5.493,-4.471 5.434,-4.308 ; -5.434,4.308 -5.493,4.471 cw(c-5.023,4.642) -5.377,4.996 -1.446,8.927 1.446,8.927 5.377,4.996 cw(c5.023,4.642) 5.493,4.471 5.434,4.308 ; -4.103,-0.707 ccw(c-5.982,-0.023) -4.103,0.661 -5.49,4.471 cw(c-5.02,4.642) -5.373,4.996 -3.14,7.23 ; -4.103,0.707 cw(c-5.982,0.023) -4.103,-0.661 -5.49,-4.471 ccw(c-5.02,-4.642) -5.373,-4.996 -3.14,-7.23 ; 0,1.477 cw(c-0.002,-0.023) 1.498,-0.023 ; 3.14,-7.23 5.373,-4.996 ccw(c5.02,-4.642) 5.49,-4.471 4.103,-0.661 cw(c5.982,0.023) 4.103,0.707 ; 3.14,7.23 5.373,4.996 cw(c5.02,4.642) 5.49,4.471 4.103,0.661 ccw(c5.982,-0.023) 4.103,-0.707

## RM6 LP TVI-1.3 - duplicate [mm]
pads (5):
  round 1.35 hole 1: 8(7.75,-5.08) 9(7.75,-2.54) 11(7.75,2.54) 12(7.75,5.08)
  round 0 hole 0.85: 10(7.75,0)
Top Layer:
  region: 6.5,-2 7,-2.5 8.425,-2.5 8.425,-1.475 6.5,-1.475
  region: 7.71,-5.775 7.71,-4.405 6.685,-4.405 6.685,-5.775
  lines w0.25: 3.7,-2.059 5.809,-2.059 7.3,-3.55 8.825,-3.55 ; 3.858,-0.066 3.858,-0.33 ccw(c5.128,-0.33) 5.128,-1.6 6.6,-1.6 6.808,-1.6 cw(c6.808,-1.998) 7.206,-1.998 7.75,-2.54 ; 3.867,-2.875 4.232,-2.509 5.569,-2.509 7.059,-4 8.8,-4 ccw(c8.8,-3.5) 9.3,-3.5 9.3,-1.2 ccw(c8.8,-1.2) 8.8,-0.7 5.952,-0.7 cw(c5.952,-0.004) 5.256,-0.004 ; 4.558,-0.062 ccw(c5.646,-0.062) 5.646,-1.15 8.806,-1.15 8.85,-3.5 ; 4.712,-3.045 5.413,-3.045 5.678,-3.309 6.719,-4.35 7.449,-5.08 7.67,-5.08 ; 8.625,-3.55 8.8,-3.55 ; 8.8,-3.55 ccw(c8.8,-3.5) 8.85,-3.5 ; 8.8,-3.55 8.85,-3.5
  lines w0.5: 3.495,-2.163 cw(c0,0.75) 0,-3.8 cw(c0,0) -3.8,0 cw(c0,0) 0,3.8 cw(c0,0) 3.8,0 ; 3.867,-2.875 cw(c0,0.75) 0,-4.55 cw(c0,0) -4.55,0 cw(c0,0) 0,4.55 cw(c0,0) 4.55,0 ; 4.617,-3.16 cw(c0,0.75) 0,-5.3 cw(c0,0) -5.3,0 cw(c0,0) 0,5.3 cw(c0,0) 5.3,0
Mid-Layer 14:
  lines w0.15: 7.75,-5.58 cw(c7.75,-5.08) 7.75,-4.58 ; 7.75,-3.04 cw(c7.75,-2.54) 7.75,-2.04 ; 7.75,2.04 cw(c7.75,2.54) 7.75,3.04 ; 7.75,4.58 cw(c7.75,5.08) 7.75,5.58
Bottom Layer:
  region: 7.71,5.775 7.71,4.405 6.685,4.405 6.685,5.775
  region: 6.5,2 7,2.5 8.425,2.5 8.425,1.475 6.5,1.475
  lines w0.25: 3.7,2.059 5.809,2.059 7.3,3.55 8.825,3.55 ; 3.858,0.066 3.858,0.33 cw(c5.128,0.33) 5.128,1.6 6.6,1.6 6.808,1.6 ccw(c6.808,1.998) 7.206,1.998 7.75,2.54 ; 3.867,2.875 4.232,2.509 5.569,2.509 7.059,4 8.8,4 cw(c8.8,3.5) 9.3,3.5 9.3,1.2 cw(c8.8,1.2) 8.8,0.7 5.952,0.7 ccw(c5.952,0.004) 5.256,0.004 ; 4.558,0.062 cw(c5.646,0.062) 5.646,1.15 8.806,1.15 8.85,3.5 ; 4.712,3.045 5.413,3.045 5.678,3.309 6.719,4.35 7.449,5.08 7.67,5.08 ; 8.625,3.55 8.8,3.55 ; 8.8,3.55 cw(c8.8,3.5) 8.85,3.5 ; 8.8,3.55 8.85,3.5
  lines w0.5: 3.495,2.163 ccw(c0,-0.75) 0,3.8 ccw(c0,0) -3.8,0 ccw(c0,0) 0,-3.8 ccw(c0,0) 3.8,0 ; 3.867,2.875 ccw(c0,-0.75) 0,4.55 ccw(c0,0) -4.55,0 ccw(c0,0) 0,-4.55 ccw(c0,0) 4.55,0 ; 4.617,3.16 ccw(c0,-0.75) 0,5.3 ccw(c0,0) -5.3,0 ccw(c0,0) 0,-5.3 ccw(c0,0) 5.3,0
Mechanical 2:
  circle w0.15: c0,0 r3.302
  lines w0.15: 4.942,-3.556 5.32,-3.556 6.141,-4.495 6.141,-5.706 6.141,-5.891 ccw(c6.5,-5.891) 6.5,-6.25 9.75,-6.25 9.75,6.25 7.541,6.25 6.5,6.25 ccw(c6.5,5.891) 6.141,5.891 6.141,5.706 6.141,4.495 5.32,3.556 4.942,3.556 ; 4.942,3.569 ccw(c0,0) -6.096,0 ccw(c0,0) 4.948,-3.56 ; 4.942,3.579 5.32,3.579 6.141,4.518 ; 7.75,6.25 ccw(c7.75,6.25) 7.75,6.25 ; 7.75,6.25 ccw(c7.75,6.25) 7.75,6.25
Mechanical 13:
  circle w0.2: c0.002,-0.023 r1.5
  lines w0.2: -5.434,-4.308 -5.493,-4.471 ccw(c-5.023,-4.642) -5.377,-4.996 -1.446,-8.927 1.446,-8.927 5.377,-4.996 ccw(c5.023,-4.642) 5.493,-4.471 5.434,-4.308 ; -5.434,4.308 -5.493,4.471 cw(c-5.023,4.642) -5.377,4.996 -1.446,8.927 1.446,8.927 5.377,4.996 cw(c5.023,4.642) 5.493,4.471 5.434,4.308 ; -4.103,-0.707 ccw(c-5.982,-0.023) -4.103,0.661 -5.49,4.471 cw(c-5.02,4.642) -5.373,4.996 -3.14,7.23 ; -4.103,0.707 cw(c-5.982,0.023) -4.103,-0.661 -5.49,-4.471 ccw(c-5.02,-4.642) -5.373,-4.996 -3.14,-7.23 ; 0,1.477 cw(c-0.002,-0.023) 1.498,-0.023 ; 3.14,-7.23 5.373,-4.996 ccw(c5.02,-4.642) 5.49,-4.471 4.103,-0.661 cw(c5.982,0.023) 4.103,0.707 ; 3.14,7.23 5.373,4.996 cw(c5.02,4.642) 5.49,4.471 4.103,0.661 ccw(c5.982,-0.023) 4.103,-0.707

## RM8 [mm]
pads (12):
  round 2.5 hole 1.2: 1(-10.16,10.16) 2(-10.16,6.35) 3(-10.16,2.54) 4(-10.16,-2.54) 5(-10.16,-6.35) 6(-10.16,-10.16) 7(10.16,-10.16) 8(10.16,-6.35) 9(10.16,-2.54) 10(10.16,2.54) 11(10.16,6.35) 12(10.16,10.16)
Top Overlay:
  lines w0.254: -15,-12.5 -15,11.75 15,11.75 15,-12.5 -15,-12.5
Mechanical 13:
  drawing of 1657 lines, arcs and shapes, not listed
3D body "RM8-K-12P-SS-DIL.STEP": height 16.9, standoff -5.7, extent -14.9,-12.329 14.9,11.7

## RM8 mini [mm]
pads (14):
  rect 2x2 hole 1.2 unplated paste-25.4: 1(8.89,6.35)
  round 2 hole 1.2 unplated paste-25.4: 2(8.89,3.81) 3(6.35,3.81) 4(-3.81,-6.35) 5(-3.81,-8.89) 6(-6.35,-8.89) 7(-8.89,-6.35) 8(-8.89,-3.81) 9(-6.35,-3.81) 10(3.81,6.35) 11(3.81,8.89) 12(6.35,8.89)
  round 2.2 hole 1.5 unplated paste-25.4: 13(8.89,-8.89) 14(-8.89,8.89)
Top Overlay:
  lines w0.254: -10.5,-10.5 10.5,-10.5 10.5,10.5 -10.5,10.5 -10.5,-10.5
  text "1" at 9.525,7.874 h1.52
Mechanical 13:
  drawing of 1596 lines, arcs and shapes, not listed
3D body "User Library-RM8.STEP": height 16.75, standoff -3.07, extent -10.51,-10.51 10.51,10.512

## RM14 [mm]
pads (12):
  round 3 hole 2: 1(-17.78,13.97) 2(-17.78,8.89) 3(-17.78,3.81) 4(-17.78,-3.81) 5(-17.78,-8.89) 6(-17.78,-13.97) 7(17.78,-13.97) 8(17.78,-8.89) 9(17.78,-3.81) 10(17.78,3.81) 11(17.78,8.89) 12(17.78,13.97)
Top Overlay:
  circle w0.15: c-20,15 r0.453
  lines w0.15: -25,-17 -9.5,-17 -6,-20.5 -3.5,-23 -1,-23 3.5,-23 6,-20.5 9.5,-17 25,-17 25,16.5 9.5,16.5 6,20 3.5,22.5 1,22.5 -3.5,22.5 -6,20 -9.5,16.5 -25,16.5 -25,-17
Mechanical 3:
  text ".Designator" at -3.555,-0.318 h2
Mechanical 13:
  lines w0.2: -25,-17 -25,16.5 -9.5,16.5 -6,20 -3.5,22.5 1,22.5 3.5,22.5 6,20 9.5,16.5 25,16.5 25,-17 9.5,-17 6,-20.5 3.5,-23 -1,-23 -3.5,-23 -6,-20.5 -9.5,-17 -25,-17
  text "1" at -21,18 h1.52
3D body "RM14 Bobbin.SLDPRT": height 29.5, standoff -4.2, extent -24.24,-15.7 24.24,15.7
3D body "RM14 Core.SLDPRT": height 16, standoff 1, extent -13.935,-21.1 13.935,21.1
3D body "RM14 Core.SLDPRT": height 31, standoff 16, extent -13.935,-21.1 13.935,21.1